# Altium footprint library ST封装.PcbLib: 1336 footprints (part 101 of 109)
Each footprint in its own frame and in the unit in brackets; x right, y up, seen from the top. Pads: shape width x height; smd on the part's side, far side on the other; paste and mask are expansions set on the pad; w line width, h text height; cw(c..) or ccw(c..) is an arc to the next point about the centre after c.
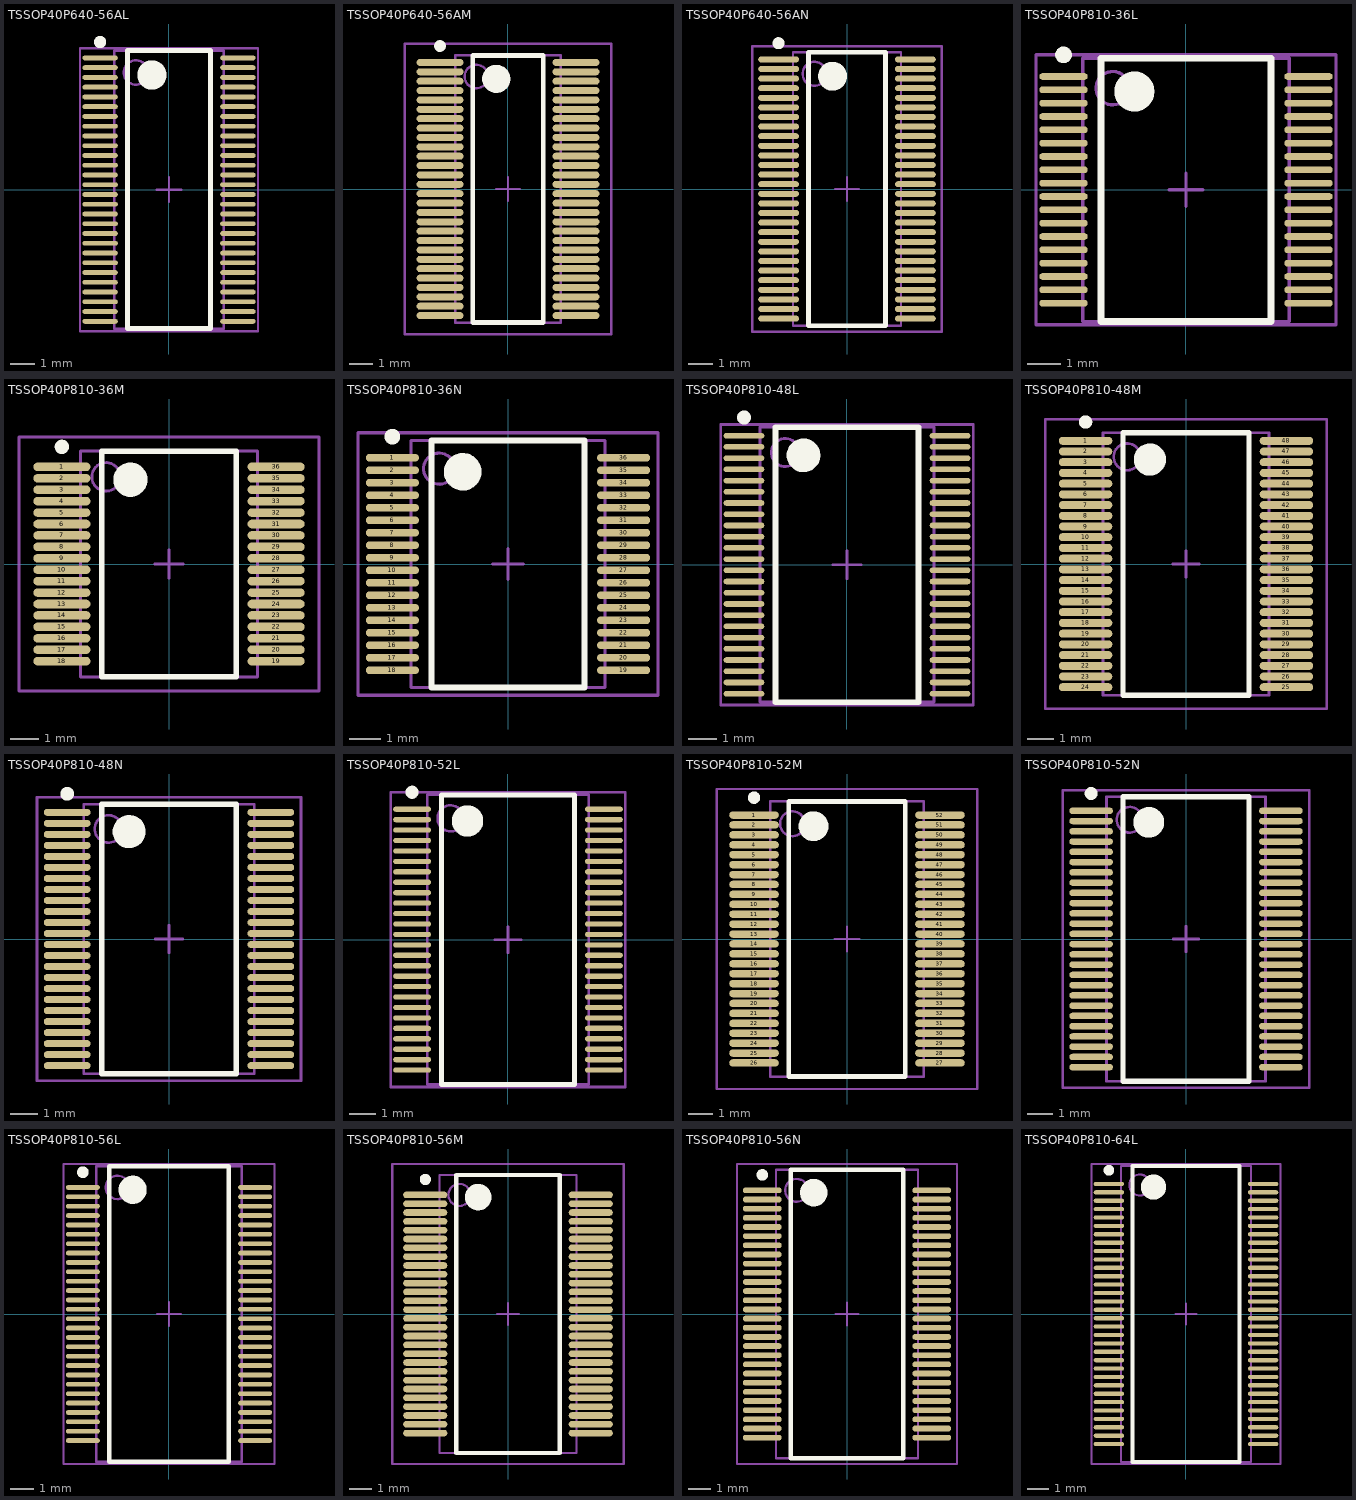
[diagram p100: the footprints below, top view; thin cyan lines are the x and y axes]

## TSSOP40P640-56AL [mm] "TSSOP, 56-Leads, Body 11.3x4.4mm, Pitch 0.4mm, IPC High Density"
height 1.2
pads (56):
  oval 1.45x0.2 smd: 1(-2.825,5.4) 2(-2.825,5) 3(-2.825,4.6) 4(-2.825,4.2) 5(-2.825,3.8) 6(-2.825,3.4) 7(-2.825,3) 8(-2.825,2.6) 9(-2.825,2.2) 10(-2.825,1.8) 11(-2.825,1.4) 12(-2.825,1) 13(-2.825,0.6) 14(-2.825,0.2) 15(-2.825,-0.2) 16(-2.825,-0.6) 17(-2.825,-1) 18(-2.825,-1.4) 19(-2.825,-1.8) 20(-2.825,-2.2) 21(-2.825,-2.6) 22(-2.825,-3) 23(-2.825,-3.4) 24(-2.825,-3.8) 25(-2.825,-4.2) 26(-2.825,-4.6) 27(-2.825,-5) 28(-2.825,-5.4) 29(2.825,-5.4) 30(2.825,-5) 31(2.825,-4.6) 32(2.825,-4.2) 33(2.825,-3.8) 34(2.825,-3.4) 35(2.825,-3) 36(2.825,-2.6) 37(2.825,-2.2) 38(2.825,-1.8) 39(2.825,-1.4) 40(2.825,-1) 41(2.825,-0.6) 42(2.825,-0.2) 43(2.825,0.2) 44(2.825,0.6) 45(2.825,1) 46(2.825,1.4) 47(2.825,1.8) 48(2.825,2.2) 49(2.825,2.6) 50(2.825,3) 51(2.825,3.4) 52(2.825,3.8) 53(2.825,4.2) 54(2.825,4.6) 55(2.825,5) 56(2.825,5.4)
Top Overlay:
  circle w0.6: c-0.7,4.7 r0.3
  circle w0.25: c-2.825,6.05 r0.125
  lines w0.2: -1.7,-5.7 1.7,-5.7 1.7,5.7 -1.7,5.7 -1.7,-5.7
Mechanical 13:
  circle w0.1: c-1.35,4.8 r0.5
  lines w0.1: -2.25,-5.7 2.25,-5.7 2.25,5.7 -2.25,5.7 -2.25,-5.7
Mechanical 15:
  lines w0.1: -0.5,0 0.5,0 ; 0,-0.5 0,0.5 ; -3.65,-5.8 3.65,-5.8 3.65,5.8 -3.65,5.8 -3.65,-5.8
3D body: height 1.2, standoff 0, extent -2.25,-5.7 2.25,5.7

## TSSOP40P640-56AM [mm] "TSSOP, 56-Leads, Body 11.3x4.4mm, Pitch 0.4mm, IPC Low Density"
height 1.2
pads (56):
  oval 2x0.3 smd: 1(-2.9,5.4) 2(-2.9,5) 3(-2.9,4.6) 4(-2.9,4.2) 5(-2.9,3.8) 6(-2.9,3.4) 7(-2.9,3) 8(-2.9,2.6) 9(-2.9,2.2) 10(-2.9,1.8) 11(-2.9,1.4) 12(-2.9,1) 13(-2.9,0.6) 14(-2.9,0.2) 15(-2.9,-0.2) 16(-2.9,-0.6) 17(-2.9,-1) 18(-2.9,-1.4) 19(-2.9,-1.8) 20(-2.9,-2.2) 21(-2.9,-2.6) 22(-2.9,-3) 23(-2.9,-3.4) 24(-2.9,-3.8) 25(-2.9,-4.2) 26(-2.9,-4.6) 27(-2.9,-5) 28(-2.9,-5.4) 29(2.9,-5.4) 30(2.9,-5) 31(2.9,-4.6) 32(2.9,-4.2) 33(2.9,-3.8) 34(2.9,-3.4) 35(2.9,-3) 36(2.9,-2.6) 37(2.9,-2.2) 38(2.9,-1.8) 39(2.9,-1.4) 40(2.9,-1) 41(2.9,-0.6) 42(2.9,-0.2) 43(2.9,0.2) 44(2.9,0.6) 45(2.9,1) 46(2.9,1.4) 47(2.9,1.8) 48(2.9,2.2) 49(2.9,2.6) 50(2.9,3) 51(2.9,3.4) 52(2.9,3.8) 53(2.9,4.2) 54(2.9,4.6) 55(2.9,5) 56(2.9,5.4)
Top Overlay:
  circle w0.6: c-0.5,4.7 r0.3
  circle w0.25: c-2.9,6.1 r0.125
  lines w0.2: -1.5,-5.7 1.5,-5.7 1.5,5.7 -1.5,5.7 -1.5,-5.7
Mechanical 13:
  circle w0.1: c-1.35,4.8 r0.5
  lines w0.1: -2.25,-5.7 2.25,-5.7 2.25,5.7 -2.25,5.7 -2.25,-5.7
Mechanical 15:
  lines w0.1: -0.5,0 0.5,0 ; 0,-0.5 0,0.5 ; -4.4,-6.2 4.4,-6.2 4.4,6.2 -4.4,6.2 -4.4,-6.2
3D body: height 1.2, standoff 0, extent -2.25,-5.7 2.25,5.7

## TSSOP40P640-56AN [mm] "TSSOP, 56-Leads, Body 11.3x4.4mm, Pitch 0.4mm, IPC Medium Density"
height 1.2
pads (56):
  oval 1.7x0.25 smd: 1(-2.85,5.4) 2(-2.85,5) 3(-2.85,4.6) 4(-2.85,4.2) 5(-2.85,3.8) 6(-2.85,3.4) 7(-2.85,3) 8(-2.85,2.6) 9(-2.85,2.2) 10(-2.85,1.8) 11(-2.85,1.4) 12(-2.85,1) 13(-2.85,0.6) 14(-2.85,0.2) 15(-2.85,-0.2) 16(-2.85,-0.6) 17(-2.85,-1) 18(-2.85,-1.4) 19(-2.85,-1.8) 20(-2.85,-2.2) 21(-2.85,-2.6) 22(-2.85,-3) 23(-2.85,-3.4) 24(-2.85,-3.8) 25(-2.85,-4.2) 26(-2.85,-4.6) 27(-2.85,-5) 28(-2.85,-5.4) 29(2.85,-5.4) 30(2.85,-5) 31(2.85,-4.6) 32(2.85,-4.2) 33(2.85,-3.8) 34(2.85,-3.4) 35(2.85,-3) 36(2.85,-2.6) 37(2.85,-2.2) 38(2.85,-1.8) 39(2.85,-1.4) 40(2.85,-1) 41(2.85,-0.6) 42(2.85,-0.2) 43(2.85,0.2) 44(2.85,0.6) 45(2.85,1) 46(2.85,1.4) 47(2.85,1.8) 48(2.85,2.2) 49(2.85,2.6) 50(2.85,3) 51(2.85,3.4) 52(2.85,3.8) 53(2.85,4.2) 54(2.85,4.6) 55(2.85,5) 56(2.85,5.4)
Top Overlay:
  circle w0.6: c-0.6,4.7 r0.3
  circle w0.25: c-2.85,6.075 r0.125
  lines w0.2: -1.6,-5.7 1.6,-5.7 1.6,5.7 -1.6,5.7 -1.6,-5.7
Mechanical 13:
  circle w0.1: c-1.35,4.8 r0.5
  lines w0.1: -2.25,-5.7 2.25,-5.7 2.25,5.7 -2.25,5.7 -2.25,-5.7
Mechanical 15:
  lines w0.1: -0.5,0 0.5,0 ; 0,-0.5 0,0.5 ; -3.95,-5.95 3.95,-5.95 3.95,5.95 -3.95,5.95 -3.95,-5.95
3D body: height 1.2, standoff 0, extent -2.25,-5.7 2.25,5.7

## TSSOP40P810-36L [mm] "TSSOP, 36-Leads, Body 7.8x6.1mm, Pitch 0.4mm, IPC High Density"
height 1.2
pads (36):
  oval 1.45x0.2 smd: 1(-3.675,3.4) 2(-3.675,3) 3(-3.675,2.6) 4(-3.675,2.2) 5(-3.675,1.8) 6(-3.675,1.4) 7(-3.675,1) 8(-3.675,0.6) 9(-3.675,0.2) 10(-3.675,-0.2) 11(-3.675,-0.6) 12(-3.675,-1) 13(-3.675,-1.4) 14(-3.675,-1.8) 15(-3.675,-2.2) 16(-3.675,-2.6) 17(-3.675,-3) 18(-3.675,-3.4) 19(3.675,-3.4) 20(3.675,-3) 21(3.675,-2.6) 22(3.675,-2.2) 23(3.675,-1.8) 24(3.675,-1.4) 25(3.675,-1) 26(3.675,-0.6) 27(3.675,-0.2) 28(3.675,0.2) 29(3.675,0.6) 30(3.675,1) 31(3.675,1.4) 32(3.675,1.8) 33(3.675,2.2) 34(3.675,2.6) 35(3.675,3) 36(3.675,3.4)
Top Overlay:
  circle w0.6: c-1.55,2.95 r0.3
  circle w0.25: c-3.675,4.05 r0.125
  lines w0.2: -2.55,-3.95 2.55,-3.95 2.55,3.95 -2.55,3.95 -2.55,-3.95
Mechanical 13:
  circle w0.1: c-2.2,3.05 r0.5
  lines w0.1: -3.1,-3.95 3.1,-3.95 3.1,3.95 -3.1,3.95 -3.1,-3.95
Mechanical 15:
  lines w0.1: -0.5,0 0.5,0 ; 0,-0.5 0,0.5 ; -4.5,-4.05 4.5,-4.05 4.5,4.05 -4.5,4.05 -4.5,-4.05
3D body: height 1.2, standoff 0, extent -3.1,-3.95 3.1,3.95

## TSSOP40P810-36M [mm] "TSSOP, 36-Leads, Body 7.8x6.1mm, Pitch 0.4mm, IPC Low Density"
height 1.2
pads (36):
  oval 2x0.3 smd: 1(-3.75,3.4) 2(-3.75,3) 3(-3.75,2.6) 4(-3.75,2.2) 5(-3.75,1.8) 6(-3.75,1.4) 7(-3.75,1) 8(-3.75,0.6) 9(-3.75,0.2) 10(-3.75,-0.2) 11(-3.75,-0.6) 12(-3.75,-1) 13(-3.75,-1.4) 14(-3.75,-1.8) 15(-3.75,-2.2) 16(-3.75,-2.6) 17(-3.75,-3) 18(-3.75,-3.4) 19(3.75,-3.4) 20(3.75,-3) 21(3.75,-2.6) 22(3.75,-2.2) 23(3.75,-1.8) 24(3.75,-1.4) 25(3.75,-1) 26(3.75,-0.6) 27(3.75,-0.2) 28(3.75,0.2) 29(3.75,0.6) 30(3.75,1) 31(3.75,1.4) 32(3.75,1.8) 33(3.75,2.2) 34(3.75,2.6) 35(3.75,3) 36(3.75,3.4)
Top Overlay:
  circle w0.25: c-3.75,4.1 r0.125
  circle w0.6: c-1.35,2.95 r0.3
  lines w0.2: -2.35,-3.95 -2.35,3.95 2.35,3.95 2.35,-3.95 -2.35,-3.95
Mechanical 13:
  circle w0.1: c-2.2,3.05 r0.5
  lines w0.1: -3.1,-3.95 -3.1,3.95 3.1,3.95 3.1,-3.95 -3.1,-3.95
Mechanical 15:
  lines w0.1: -0.5,0 0.5,0 ; 0,-0.5 0,0.5 ; -5.25,-4.45 -5.25,4.45 5.25,4.45 5.25,-4.45 -5.25,-4.45
3D body: height 1.2, standoff 0, extent -3.1,-3.95 3.1,3.95

## TSSOP40P810-36N [mm] "TSSOP, 36-Leads, Body 7.8x6.1mm, Pitch 0.4mm, IPC Medium Density"
height 1.2
pads (36):
  oval 1.7x0.25 smd: 1(-3.7,3.4) 2(-3.7,3) 3(-3.7,2.6) 4(-3.7,2.2) 5(-3.7,1.8) 6(-3.7,1.4) 7(-3.7,1) 8(-3.7,0.6) 9(-3.7,0.2) 10(-3.7,-0.2) 11(-3.7,-0.6) 12(-3.7,-1) 13(-3.7,-1.4) 14(-3.7,-1.8) 15(-3.7,-2.2) 16(-3.7,-2.6) 17(-3.7,-3) 18(-3.7,-3.4) 19(3.7,-3.4) 20(3.7,-3) 21(3.7,-2.6) 22(3.7,-2.2) 23(3.7,-1.8) 24(3.7,-1.4) 25(3.7,-1) 26(3.7,-0.6) 27(3.7,-0.2) 28(3.7,0.2) 29(3.7,0.6) 30(3.7,1) 31(3.7,1.4) 32(3.7,1.8) 33(3.7,2.2) 34(3.7,2.6) 35(3.7,3) 36(3.7,3.4)
Top Overlay:
  circle w0.6: c-1.45,2.95 r0.3
  circle w0.25: c-3.7,4.075 r0.125
  lines w0.2: -2.45,-3.95 2.45,-3.95 2.45,3.95 -2.45,3.95 -2.45,-3.95
Mechanical 13:
  circle w0.1: c-2.2,3.05 r0.5
  lines w0.1: -3.1,-3.95 3.1,-3.95 3.1,3.95 -3.1,3.95 -3.1,-3.95
Mechanical 15:
  lines w0.1: -0.5,0 0.5,0 ; 0,-0.5 0,0.5 ; -4.8,-4.2 4.8,-4.2 4.8,4.2 -4.8,4.2 -4.8,-4.2
3D body: height 1.2, standoff 0, extent -3.1,-3.95 3.1,3.95

## TSSOP40P810-48L [mm] "TSSOP, 48-Leads, Body 9.7x6.1mm, Pitch 0.4mm, IPC High Density"
height 1.2
pads (48):
  oval 1.45x0.2 smd: 1(-3.675,4.6) 2(-3.675,4.2) 3(-3.675,3.8) 4(-3.675,3.4) 5(-3.675,3) 6(-3.675,2.6) 7(-3.675,2.2) 8(-3.675,1.8) 9(-3.675,1.4) 10(-3.675,1) 11(-3.675,0.6) 12(-3.675,0.2) 13(-3.675,-0.2) 14(-3.675,-0.6) 15(-3.675,-1) 16(-3.675,-1.4) 17(-3.675,-1.8) 18(-3.675,-2.2) 19(-3.675,-2.6) 20(-3.675,-3) 21(-3.675,-3.4) 22(-3.675,-3.8) 23(-3.675,-4.2) 24(-3.675,-4.6) 25(3.675,-4.6) 26(3.675,-4.2) 27(3.675,-3.8) 28(3.675,-3.4) 29(3.675,-3) 30(3.675,-2.6) 31(3.675,-2.2) 32(3.675,-1.8) 33(3.675,-1.4) 34(3.675,-1) 35(3.675,-0.6) 36(3.675,-0.2) 37(3.675,0.2) 38(3.675,0.6) 39(3.675,1) 40(3.675,1.4) 41(3.675,1.8) 42(3.675,2.2) 43(3.675,2.6) 44(3.675,3) 45(3.675,3.4) 46(3.675,3.8) 47(3.675,4.2) 48(3.675,4.6)
Top Overlay:
  circle w0.6: c-1.55,3.9 r0.3
  circle w0.25: c-3.675,5.25 r0.125
  lines w0.2: -2.55,-4.9 2.55,-4.9 2.55,4.9 -2.55,4.9 -2.55,-4.9
Mechanical 13:
  circle w0.1: c-2.2,4 r0.5
  lines w0.1: -3.1,-4.9 3.1,-4.9 3.1,4.9 -3.1,4.9 -3.1,-4.9
Mechanical 15:
  lines w0.1: -0.5,0 0.5,0 ; 0,-0.5 0,0.5 ; -4.5,-5 4.5,-5 4.5,5 -4.5,5 -4.5,-5
3D body: height 1.2, standoff 0, extent -3.1,-4.9 3.1,4.9

## TSSOP40P810-48M [mm] "TSSOP, 48-Leads, Body 9.7x6.1mm, Pitch 0.4mm, IPC Low Density"
height 1.2
pads (48):
  oval 2x0.3 smd: 1(-3.75,4.6) 2(-3.75,4.2) 3(-3.75,3.8) 4(-3.75,3.4) 5(-3.75,3) 6(-3.75,2.6) 7(-3.75,2.2) 8(-3.75,1.8) 9(-3.75,1.4) 10(-3.75,1) 11(-3.75,0.6) 12(-3.75,0.2) 13(-3.75,-0.2) 14(-3.75,-0.6) 15(-3.75,-1) 16(-3.75,-1.4) 17(-3.75,-1.8) 18(-3.75,-2.2) 19(-3.75,-2.6) 20(-3.75,-3) 21(-3.75,-3.4) 22(-3.75,-3.8) 23(-3.75,-4.2) 24(-3.75,-4.6) 25(3.75,-4.6) 26(3.75,-4.2) 27(3.75,-3.8) 28(3.75,-3.4) 29(3.75,-3) 30(3.75,-2.6) 31(3.75,-2.2) 32(3.75,-1.8) 33(3.75,-1.4) 34(3.75,-1) 35(3.75,-0.6) 36(3.75,-0.2) 37(3.75,0.2) 38(3.75,0.6) 39(3.75,1) 40(3.75,1.4) 41(3.75,1.8) 42(3.75,2.2) 43(3.75,2.6) 44(3.75,3) 45(3.75,3.4) 46(3.75,3.8) 47(3.75,4.2) 48(3.75,4.6)
Top Overlay:
  circle w0.6: c-1.35,3.9 r0.3
  circle w0.25: c-3.75,5.3 r0.125
  lines w0.2: -2.35,-4.9 2.35,-4.9 2.35,4.9 -2.35,4.9 -2.35,-4.9
Mechanical 13:
  circle w0.1: c-2.2,4 r0.5
  lines w0.1: -3.1,-4.9 3.1,-4.9 3.1,4.9 -3.1,4.9 -3.1,-4.9
Mechanical 15:
  lines w0.1: -0.5,0 0.5,0 ; 0,-0.5 0,0.5 ; -5.25,-5.4 5.25,-5.4 5.25,5.4 -5.25,5.4 -5.25,-5.4
3D body: height 1.2, standoff 0, extent -3.1,-4.9 3.1,4.9

## TSSOP40P810-48N [mm] "TSSOP, 48-Leads, Body 9.7x6.1mm, Pitch 0.4mm, IPC Medium Density"
height 1.2
pads (48):
  oval 1.7x0.25 smd: 1(-3.7,4.6) 2(-3.7,4.2) 3(-3.7,3.8) 4(-3.7,3.4) 5(-3.7,3) 6(-3.7,2.6) 7(-3.7,2.2) 8(-3.7,1.8) 9(-3.7,1.4) 10(-3.7,1) 11(-3.7,0.6) 12(-3.7,0.2) 13(-3.7,-0.2) 14(-3.7,-0.6) 15(-3.7,-1) 16(-3.7,-1.4) 17(-3.7,-1.8) 18(-3.7,-2.2) 19(-3.7,-2.6) 20(-3.7,-3) 21(-3.7,-3.4) 22(-3.7,-3.8) 23(-3.7,-4.2) 24(-3.7,-4.6) 25(3.7,-4.6) 26(3.7,-4.2) 27(3.7,-3.8) 28(3.7,-3.4) 29(3.7,-3) 30(3.7,-2.6) 31(3.7,-2.2) 32(3.7,-1.8) 33(3.7,-1.4) 34(3.7,-1) 35(3.7,-0.6) 36(3.7,-0.2) 37(3.7,0.2) 38(3.7,0.6) 39(3.7,1) 40(3.7,1.4) 41(3.7,1.8) 42(3.7,2.2) 43(3.7,2.6) 44(3.7,3) 45(3.7,3.4) 46(3.7,3.8) 47(3.7,4.2) 48(3.7,4.6)
Top Overlay:
  circle w0.6: c-1.45,3.9 r0.3
  circle w0.25: c-3.7,5.275 r0.125
  lines w0.2: -2.45,-4.9 2.45,-4.9 2.45,4.9 -2.45,4.9 -2.45,-4.9
Mechanical 13:
  circle w0.1: c-2.2,4 r0.5
  lines w0.1: -3.1,-4.9 3.1,-4.9 3.1,4.9 -3.1,4.9 -3.1,-4.9
Mechanical 15:
  lines w0.1: -0.5,0 0.5,0 ; 0,-0.5 0,0.5 ; -4.8,-5.15 4.8,-5.15 4.8,5.15 -4.8,5.15 -4.8,-5.15
3D body: height 1.2, standoff 0, extent -3.1,-4.9 3.1,4.9

## TSSOP40P810-52L [mm] "TSSOP, 52-Leads, Body 11x6.1mm, Pitch 0.4mm, IPC High Density"
height 1.2
pads (52):
  oval 1.45x0.2 smd: 1(-3.675,5) 2(-3.675,4.6) 3(-3.675,4.2) 4(-3.675,3.8) 5(-3.675,3.4) 6(-3.675,3) 7(-3.675,2.6) 8(-3.675,2.2) 9(-3.675,1.8) 10(-3.675,1.4) 11(-3.675,1) 12(-3.675,0.6) 13(-3.675,0.2) 14(-3.675,-0.2) 15(-3.675,-0.6) 16(-3.675,-1) 17(-3.675,-1.4) 18(-3.675,-1.8) 19(-3.675,-2.2) 20(-3.675,-2.6) 21(-3.675,-3) 22(-3.675,-3.4) 23(-3.675,-3.8) 24(-3.675,-4.2) 25(-3.675,-4.6) 26(-3.675,-5) 27(3.675,-5) 28(3.675,-4.6) 29(3.675,-4.2) 30(3.675,-3.8) 31(3.675,-3.4) 32(3.675,-3) 33(3.675,-2.6) 34(3.675,-2.2) 35(3.675,-1.8) 36(3.675,-1.4) 37(3.675,-1) 38(3.675,-0.6) 39(3.675,-0.2) 40(3.675,0.2) 41(3.675,0.6) 42(3.675,1) 43(3.675,1.4) 44(3.675,1.8) 45(3.675,2.2) 46(3.675,2.6) 47(3.675,3) 48(3.675,3.4) 49(3.675,3.8) 50(3.675,4.2) 51(3.675,4.6) 52(3.675,5)
Top Overlay:
  circle w0.6: c-1.55,4.55 r0.3
  circle w0.25: c-3.675,5.65 r0.125
  lines w0.2: -2.55,-5.55 2.55,-5.55 2.55,5.55 -2.55,5.55 -2.55,-5.55
Mechanical 13:
  circle w0.1: c-2.2,4.65 r0.5
  lines w0.1: -3.1,-5.55 3.1,-5.55 3.1,5.55 -3.1,5.55 -3.1,-5.55
Mechanical 15:
  lines w0.1: -0.5,0 0.5,0 ; 0,-0.5 0,0.5 ; -4.5,-5.65 4.5,-5.65 4.5,5.65 -4.5,5.65 -4.5,-5.65
3D body: height 1.2, standoff 0, extent -3.1,-5.55 3.1,5.55

## TSSOP40P810-52M [mm] "TSSOP, 52-Leads, Body 11x6.1mm, Pitch 0.4mm, IPC Low Density"
height 1.2
pads (52):
  oval 2x0.3 smd: 1(-3.75,5) 2(-3.75,4.6) 3(-3.75,4.2) 4(-3.75,3.8) 5(-3.75,3.4) 6(-3.75,3) 7(-3.75,2.6) 8(-3.75,2.2) 9(-3.75,1.8) 10(-3.75,1.4) 11(-3.75,1) 12(-3.75,0.6) 13(-3.75,0.2) 14(-3.75,-0.2) 15(-3.75,-0.6) 16(-3.75,-1) 17(-3.75,-1.4) 18(-3.75,-1.8) 19(-3.75,-2.2) 20(-3.75,-2.6) 21(-3.75,-3) 22(-3.75,-3.4) 23(-3.75,-3.8) 24(-3.75,-4.2) 25(-3.75,-4.6) 26(-3.75,-5) 27(3.75,-5) 28(3.75,-4.6) 29(3.75,-4.2) 30(3.75,-3.8) 31(3.75,-3.4) 32(3.75,-3) 33(3.75,-2.6) 34(3.75,-2.2) 35(3.75,-1.8) 36(3.75,-1.4) 37(3.75,-1) 38(3.75,-0.6) 39(3.75,-0.2) 40(3.75,0.2) 41(3.75,0.6) 42(3.75,1) 43(3.75,1.4) 44(3.75,1.8) 45(3.75,2.2) 46(3.75,2.6) 47(3.75,3) 48(3.75,3.4) 49(3.75,3.8) 50(3.75,4.2) 51(3.75,4.6) 52(3.75,5)
Top Overlay:
  circle w0.25: c-3.75,5.7 r0.125
  circle w0.6: c-1.35,4.55 r0.3
  lines w0.2: -2.35,-5.55 -2.35,5.55 2.35,5.55 2.35,-5.55 -2.35,-5.55
Mechanical 13:
  circle w0.1: c-2.2,4.65 r0.5
  lines w0.1: -3.1,-5.55 -3.1,5.55 3.1,5.55 3.1,-5.55 -3.1,-5.55
Mechanical 15:
  lines w0.1: -0.5,0 0.5,0 ; 0,-0.5 0,0.5 ; -5.25,-6.05 -5.25,6.05 5.25,6.05 5.25,-6.05 -5.25,-6.05
3D body: height 1.2, standoff 0, extent -3.1,-5.55 3.1,5.55

## TSSOP40P810-52N [mm] "TSSOP, 52-Leads, Body 11x6.1mm, Pitch 0.4mm, IPC Medium Density"
height 1.2
pads (52):
  oval 1.7x0.25 smd: 1(-3.7,5) 2(-3.7,4.6) 3(-3.7,4.2) 4(-3.7,3.8) 5(-3.7,3.4) 6(-3.7,3) 7(-3.7,2.6) 8(-3.7,2.2) 9(-3.7,1.8) 10(-3.7,1.4) 11(-3.7,1) 12(-3.7,0.6) 13(-3.7,0.2) 14(-3.7,-0.2) 15(-3.7,-0.6) 16(-3.7,-1) 17(-3.7,-1.4) 18(-3.7,-1.8) 19(-3.7,-2.2) 20(-3.7,-2.6) 21(-3.7,-3) 22(-3.7,-3.4) 23(-3.7,-3.8) 24(-3.7,-4.2) 25(-3.7,-4.6) 26(-3.7,-5) 27(3.7,-5) 28(3.7,-4.6) 29(3.7,-4.2) 30(3.7,-3.8) 31(3.7,-3.4) 32(3.7,-3) 33(3.7,-2.6) 34(3.7,-2.2) 35(3.7,-1.8) 36(3.7,-1.4) 37(3.7,-1) 38(3.7,-0.6) 39(3.7,-0.2) 40(3.7,0.2) 41(3.7,0.6) 42(3.7,1) 43(3.7,1.4) 44(3.7,1.8) 45(3.7,2.2) 46(3.7,2.6) 47(3.7,3) 48(3.7,3.4) 49(3.7,3.8) 50(3.7,4.2) 51(3.7,4.6) 52(3.7,5)
Top Overlay:
  circle w0.25: c-3.7,5.675 r0.125
  circle w0.6: c-1.45,4.55 r0.3
  lines w0.2: -2.45,-5.55 -2.45,5.55 2.45,5.55 2.45,-5.55 -2.45,-5.55
Mechanical 13:
  circle w0.1: c-2.2,4.65 r0.5
  lines w0.1: -3.1,-5.55 -3.1,5.55 3.1,5.55 3.1,-5.55 -3.1,-5.55
Mechanical 15:
  lines w0.1: -0.5,0 0.5,0 ; 0,-0.5 0,0.5 ; -4.8,-5.8 -4.8,5.8 4.8,5.8 4.8,-5.8 -4.8,-5.8
3D body: height 1.2, standoff 0, extent -3.1,-5.55 3.1,5.55

## TSSOP40P810-56L [mm] "TSSOP, 56-Leads, Body 12.5x6.1mm, Pitch 0.4mm, IPC High Density"
height 1.2
pads (56):
  oval 1.45x0.2 smd: 1(-3.675,5.4) 2(-3.675,5) 3(-3.675,4.6) 4(-3.675,4.2) 5(-3.675,3.8) 6(-3.675,3.4) 7(-3.675,3) 8(-3.675,2.6) 9(-3.675,2.2) 10(-3.675,1.8) 11(-3.675,1.4) 12(-3.675,1) 13(-3.675,0.6) 14(-3.675,0.2) 15(-3.675,-0.2) 16(-3.675,-0.6) 17(-3.675,-1) 18(-3.675,-1.4) 19(-3.675,-1.8) 20(-3.675,-2.2) 21(-3.675,-2.6) 22(-3.675,-3) 23(-3.675,-3.4) 24(-3.675,-3.8) 25(-3.675,-4.2) 26(-3.675,-4.6) 27(-3.675,-5) 28(-3.675,-5.4) 29(3.675,-5.4) 30(3.675,-5) 31(3.675,-4.6) 32(3.675,-4.2) 33(3.675,-3.8) 34(3.675,-3.4) 35(3.675,-3) 36(3.675,-2.6) 37(3.675,-2.2) 38(3.675,-1.8) 39(3.675,-1.4) 40(3.675,-1) 41(3.675,-0.6) 42(3.675,-0.2) 43(3.675,0.2) 44(3.675,0.6) 45(3.675,1) 46(3.675,1.4) 47(3.675,1.8) 48(3.675,2.2) 49(3.675,2.6) 50(3.675,3) 51(3.675,3.4) 52(3.675,3.8) 53(3.675,4.2) 54(3.675,4.6) 55(3.675,5) 56(3.675,5.4)
Top Overlay:
  circle w0.6: c-1.55,5.3 r0.3
  circle w0.25: c-3.675,6.05 r0.125
  lines w0.2: -2.55,-6.3 2.55,-6.3 2.55,6.3 -2.55,6.3 -2.55,-6.3
Mechanical 13:
  circle w0.1: c-2.2,5.4 r0.5
  lines w0.1: -3.1,-6.3 3.1,-6.3 3.1,6.3 -3.1,6.3 -3.1,-6.3
Mechanical 15:
  lines w0.1: -0.5,0 0.5,0 ; 0,-0.5 0,0.5 ; -4.5,-6.4 4.5,-6.4 4.5,6.4 -4.5,6.4 -4.5,-6.4
3D body: height 1.2, standoff 0, extent -3.1,-6.3 3.1,6.3

## TSSOP40P810-56M [mm] "TSSOP, 56-Leads, Body 12.5x6.1mm, Pitch 0.4mm, IPC Low Density"
height 1.2
pads (56):
  oval 2x0.3 smd: 1(-3.75,5.4) 2(-3.75,5) 3(-3.75,4.6) 4(-3.75,4.2) 5(-3.75,3.8) 6(-3.75,3.4) 7(-3.75,3) 8(-3.75,2.6) 9(-3.75,2.2) 10(-3.75,1.8) 11(-3.75,1.4) 12(-3.75,1) 13(-3.75,0.6) 14(-3.75,0.2) 15(-3.75,-0.2) 16(-3.75,-0.6) 17(-3.75,-1) 18(-3.75,-1.4) 19(-3.75,-1.8) 20(-3.75,-2.2) 21(-3.75,-2.6) 22(-3.75,-3) 23(-3.75,-3.4) 24(-3.75,-3.8) 25(-3.75,-4.2) 26(-3.75,-4.6) 27(-3.75,-5) 28(-3.75,-5.4) 29(3.75,-5.4) 30(3.75,-5) 31(3.75,-4.6) 32(3.75,-4.2) 33(3.75,-3.8) 34(3.75,-3.4) 35(3.75,-3) 36(3.75,-2.6) 37(3.75,-2.2) 38(3.75,-1.8) 39(3.75,-1.4) 40(3.75,-1) 41(3.75,-0.6) 42(3.75,-0.2) 43(3.75,0.2) 44(3.75,0.6) 45(3.75,1) 46(3.75,1.4) 47(3.75,1.8) 48(3.75,2.2) 49(3.75,2.6) 50(3.75,3) 51(3.75,3.4) 52(3.75,3.8) 53(3.75,4.2) 54(3.75,4.6) 55(3.75,5) 56(3.75,5.4)
Top Overlay:
  circle w0.6: c-1.35,5.3 r0.3
  circle w0.25: c-3.75,6.1 r0.125
  lines w0.2: -2.35,-6.3 2.35,-6.3 2.35,6.3 -2.35,6.3 -2.35,-6.3
Mechanical 13:
  circle w0.1: c-2.2,5.4 r0.5
  lines w0.1: -3.1,-6.3 3.1,-6.3 3.1,6.3 -3.1,6.3 -3.1,-6.3
Mechanical 15:
  lines w0.1: -0.5,0 0.5,0 ; 0,-0.5 0,0.5 ; -5.25,-6.8 5.25,-6.8 5.25,6.8 -5.25,6.8 -5.25,-6.8
3D body: height 1.2, standoff 0, extent -3.1,-6.3 3.1,6.3

## TSSOP40P810-56N [mm] "TSSOP, 56-Leads, Body 12.5x6.1mm, Pitch 0.4mm, IPC Medium Density"
height 1.2
pads (56):
  oval 1.7x0.25 smd: 1(-3.7,5.4) 2(-3.7,5) 3(-3.7,4.6) 4(-3.7,4.2) 5(-3.7,3.8) 6(-3.7,3.4) 7(-3.7,3) 8(-3.7,2.6) 9(-3.7,2.2) 10(-3.7,1.8) 11(-3.7,1.4) 12(-3.7,1) 13(-3.7,0.6) 14(-3.7,0.2) 15(-3.7,-0.2) 16(-3.7,-0.6) 17(-3.7,-1) 18(-3.7,-1.4) 19(-3.7,-1.8) 20(-3.7,-2.2) 21(-3.7,-2.6) 22(-3.7,-3) 23(-3.7,-3.4) 24(-3.7,-3.8) 25(-3.7,-4.2) 26(-3.7,-4.6) 27(-3.7,-5) 28(-3.7,-5.4) 29(3.7,-5.4) 30(3.7,-5) 31(3.7,-4.6) 32(3.7,-4.2) 33(3.7,-3.8) 34(3.7,-3.4) 35(3.7,-3) 36(3.7,-2.6) 37(3.7,-2.2) 38(3.7,-1.8) 39(3.7,-1.4) 40(3.7,-1) 41(3.7,-0.6) 42(3.7,-0.2) 43(3.7,0.2) 44(3.7,0.6) 45(3.7,1) 46(3.7,1.4) 47(3.7,1.8) 48(3.7,2.2) 49(3.7,2.6) 50(3.7,3) 51(3.7,3.4) 52(3.7,3.8) 53(3.7,4.2) 54(3.7,4.6) 55(3.7,5) 56(3.7,5.4)
Top Overlay:
  circle w0.6: c-1.45,5.3 r0.3
  circle w0.25: c-3.7,6.075 r0.125
  lines w0.2: -2.45,-6.3 2.45,-6.3 2.45,6.3 -2.45,6.3 -2.45,-6.3
Mechanical 13:
  circle w0.1: c-2.2,5.4 r0.5
  lines w0.1: -3.1,-6.3 3.1,-6.3 3.1,6.3 -3.1,6.3 -3.1,-6.3
Mechanical 15:
  lines w0.1: -0.5,0 0.5,0 ; 0,-0.5 0,0.5 ; -4.8,-6.55 4.8,-6.55 4.8,6.55 -4.8,6.55 -4.8,-6.55
3D body: height 1.2, standoff 0, extent -3.1,-6.3 3.1,6.3

## TSSOP40P810-64L [mm] "TSSOP, 64-Leads, Body 14x6.1mm, Pitch 0.4mm, IPC High Density"
height 1.2
pads (64):
  oval 1.45x0.2 smd: 1(-3.675,6.2) 2(-3.675,5.8) 3(-3.675,5.4) 4(-3.675,5) 5(-3.675,4.6) 6(-3.675,4.2) 7(-3.675,3.8) 8(-3.675,3.4) 9(-3.675,3) 10(-3.675,2.6) 11(-3.675,2.2) 12(-3.675,1.8) 13(-3.675,1.4) 14(-3.675,1) 15(-3.675,0.6) 16(-3.675,0.2) 17(-3.675,-0.2) 18(-3.675,-0.6) 19(-3.675,-1) 20(-3.675,-1.4) 21(-3.675,-1.8) 22(-3.675,-2.2) 23(-3.675,-2.6) 24(-3.675,-3) 25(-3.675,-3.4) 26(-3.675,-3.8) 27(-3.675,-4.2) 28(-3.675,-4.6) 29(-3.675,-5) 30(-3.675,-5.4) 31(-3.675,-5.8) 32(-3.675,-6.2) 33(3.675,-6.2) 34(3.675,-5.8) 35(3.675,-5.4) 36(3.675,-5) 37(3.675,-4.6) 38(3.675,-4.2) 39(3.675,-3.8) 40(3.675,-3.4) 41(3.675,-3) 42(3.675,-2.6) 43(3.675,-2.2) 44(3.675,-1.8) 45(3.675,-1.4) 46(3.675,-1) 47(3.675,-0.6) 48(3.675,-0.2) 49(3.675,0.2) 50(3.675,0.6) 51(3.675,1) 52(3.675,1.4) 53(3.675,1.8) 54(3.675,2.2) 55(3.675,2.6) 56(3.675,3) 57(3.675,3.4) 58(3.675,3.8) 59(3.675,4.2) 60(3.675,4.6) 61(3.675,5) 62(3.675,5.4) 63(3.675,5.8) 64(3.675,6.2)
Top Overlay:
  circle w0.6: c-1.55,6.05 r0.3
  circle w0.25: c-3.675,6.85 r0.125
  lines w0.2: -2.55,-7.05 2.55,-7.05 2.55,7.05 -2.55,7.05 -2.55,-7.05
Mechanical 13:
  circle w0.1: c-2.2,6.15 r0.5
  lines w0.1: -3.1,-7.05 3.1,-7.05 3.1,7.05 -3.1,7.05 -3.1,-7.05
Mechanical 15:
  lines w0.1: -0.5,0 0.5,0 ; 0,-0.5 0,0.5 ; -4.5,-7.15 4.5,-7.15 4.5,7.15 -4.5,7.15 -4.5,-7.15
3D body: height 1.2, standoff 0, extent -3.1,-7.05 3.1,7.05